# Altium footprint library Miscellaneous C_nn.PcbLib: 416 footprints (part 11 of 26)
Each footprint in its own frame and in the unit in brackets; x right, y up, seen from the top. Pads: shape width x height; smd on the part's side, far side on the other; paste and mask are expansions set on the pad; w line width, h text height; cw(c..) or ccw(c..) is an arc to the next point about the centre after c.
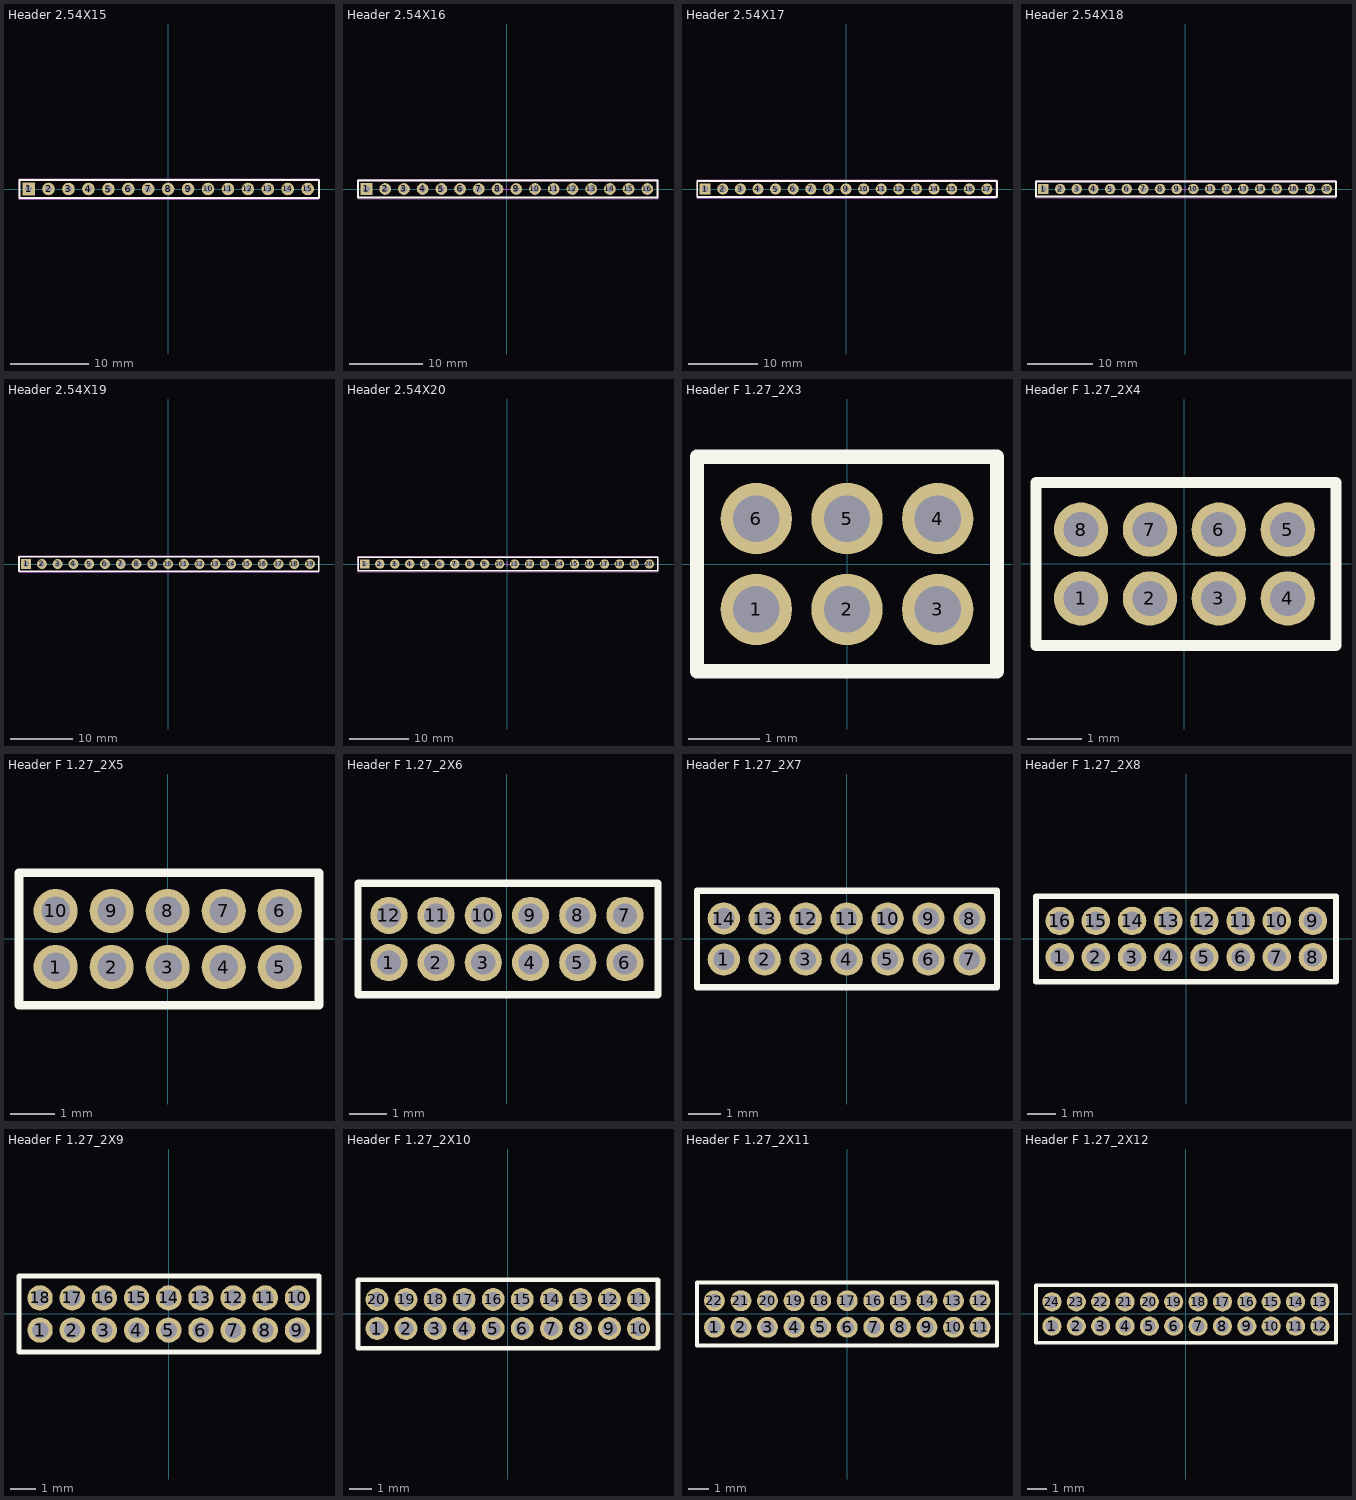
[diagram p10: the footprints below, top view; thin cyan lines are the x and y axes]

## Header 2.54X15 [mm]
pads (15):
  rect 1.6x1.6 hole 0.9: 1(-17.78,0)
  round 1.6 hole 0.9: 2(-15.24,0) 3(-12.7,0) 4(-10.16,0) 5(-7.62,0) 6(-5.08,0) 7(-2.54,0) 8(0,0) 9(2.54,0) 10(5.08,0) 11(7.62,0) 12(10.16,0) 13(12.7,0) 14(15.24,0) 15(17.78,0)
Top Overlay:
  lines w0.254: -18.923,-1.143 19.22,-1.143 19.22,1.143 -18.923,1.143 -18.923,-1.143
Mechanical 15:
  lines w0.1: -19,-1.3 19.2,-1.3 19.2,1.3 -19,1.3 -19,-1.3
3D body "HEADER 2.54X15.stp": height 8.3, standoff -2.9, extent -18.923,-1.228 19.177,1.27

## Header 2.54X16 [mm]
pads (16):
  rect 1.6x1.6 hole 0.9: 1(-19.05,0)
  round 1.6 hole 0.9: 2(-16.51,0) 3(-13.97,0) 4(-11.43,0) 5(-8.89,0) 6(-6.35,0) 7(-3.81,0) 8(-1.27,0) 9(1.27,0) 10(3.81,0) 11(6.35,0) 12(8.89,0) 13(11.43,0) 14(13.97,0) 15(16.51,0) 16(19.05,0)
Top Overlay:
  lines w0.254: -20.193,-1.143 20.45,-1.143 20.45,1.143 -20.193,1.143 -20.193,-1.143
Mechanical 15:
  lines w0.1: -0.5,0 0.5,0 ; 0,-0.5 0,0.5 ; -20.2,-1.3 20.5,-1.3 20.5,1.3 -20.2,1.3 -20.2,-1.3
3D body "HEADER 2.54X16.stp": height 8.3, standoff -2.9, extent -20.193,-1.228 20.447,1.27

## Header 2.54X17 [mm]
pads (17):
  rect 1.6x1.6 hole 0.9: 1(-20.32,0)
  round 1.6 hole 0.9: 2(-17.78,0) 3(-15.24,0) 4(-12.7,0) 5(-10.16,0) 6(-7.62,0) 7(-5.08,0) 8(-2.54,0) 9(0,0) 10(2.54,0) 11(5.08,0) 12(7.62,0) 13(10.16,0) 14(12.7,0) 15(15.24,0) 16(17.78,0) 17(20.32,0)
Top Overlay:
  lines w0.254: -21.463,-1.143 -21.463,1.143 21.78,1.143 21.78,-1.143 -21.463,-1.143
Mechanical 15:
  lines w0.1: -21.5,-1.3 -21.5,1.3 21.7,1.3 21.7,-1.3 -21.5,-1.3
3D body "HEADER 2.54X17.stp": height 8.3, standoff -2.9, extent -21.463,-1.228 21.717,1.27

## Header 2.54X18 [mm]
pads (18):
  rect 1.6x1.6 hole 0.9: 1(-21.59,0)
  round 1.6 hole 0.9: 2(-19.05,0) 3(-16.51,0) 4(-13.97,0) 5(-11.43,0) 6(-8.89,0) 7(-6.35,0) 8(-3.81,0) 9(-1.27,0) 10(1.27,0) 11(3.81,0) 12(6.35,0) 13(8.89,0) 14(11.43,0) 15(13.97,0) 16(16.51,0) 17(19.05,0) 18(21.59,0)
Top Overlay:
  lines w0.254: -22.733,-1.143 -22.733,1.143 23.01,1.143 23.01,-1.143 -22.733,-1.143
Mechanical 15:
  lines w0.1: -0.5,0 0.5,0 ; 0,-0.5 0,0.5 ; -22.7,-1.3 -22.7,1.3 23,1.3 23,-1.3 -22.7,-1.3
3D body "HEADER 2.54X18.stp": height 8.3, standoff -2.9, extent -22.733,-1.228 22.987,1.27

## Header 2.54X19 [mm]
pads (19):
  rect 1.6x1.6 hole 0.9: 1(-22.86,0)
  round 1.6 hole 0.9: 2(-20.32,0) 3(-17.78,0) 4(-15.24,0) 5(-12.7,0) 6(-10.16,0) 7(-7.62,0) 8(-5.08,0) 9(-2.54,0) 10(0,0) 11(2.54,0) 12(5.08,0) 13(7.62,0) 14(10.16,0) 15(12.7,0) 16(15.24,0) 17(17.78,0) 18(20.32,0) 19(22.86,0)
Top Overlay:
  lines w0.254: -24.003,-1.143 24.24,-1.143 24.24,1.143 -24.003,1.143 -24.003,-1.143
Mechanical 15:
  lines w0.1: -24,-1.3 24.3,-1.3 24.3,1.3 -24,1.3 -24,-1.3
3D body "HEADER 2.54X19.stp": height 8.3, standoff -2.9, extent -24.003,-1.228 24.257,1.27

## Header 2.54X20 [mm]
pads (20):
  rect 1.6x1.6 hole 0.9: 1(-24.13,0)
  round 1.6 hole 0.9: 2(-21.59,0) 3(-19.05,0) 4(-16.51,0) 5(-13.97,0) 6(-11.43,0) 7(-8.89,0) 8(-6.35,0) 9(-3.81,0) 10(-1.27,0) 11(1.27,0) 12(3.81,0) 13(6.35,0) 14(8.89,0) 15(11.43,0) 16(13.97,0) 17(16.51,0) 18(19.05,0) 19(21.59,0) 20(24.13,0)
Top Overlay:
  lines w0.254: -25.273,-1.143 -25.273,1.143 25.57,1.143 25.57,-1.143 -25.273,-1.143
Mechanical 15:
  lines w0.1: -0.5,0 0.5,0 ; 0,-0.5 0,0.5 ; -25.3,-1.3 -25.3,1.3 25.6,1.3 25.6,-1.3 -25.3,-1.3
3D body "HEADER 2.54X20.stp": height 8.3, standoff -2.9, extent -25.273,-1.228 25.527,1.27

## Header F 1.27_2X3 [mm]
pads (6):
  round 1 hole 0.65: 1(-1.27,-0.635) 2(0,-0.635) 3(1.27,-0.635) 4(1.27,0.635) 5(0,0.635) 6(-1.27,0.635)
Top Overlay:
  lines w0.2: -2.1,-1.5 -2.1,1.5 2.1,1.5 2.1,-1.5 -2.1,-1.5
Mechanical 15:
  lines w0.1: -2.1,-1.5 2.1,-1.5 2.1,1.5 -2.1,1.5 -2.1,-1.5
3D body "Header-F-1.27-2X6.stp": height 3.4, standoff -2.4, extent -2.105,-1.5 2.105,1.6

## Header F 1.27_2X4 [mm]
pads (8):
  round 1 hole 0.65: 1(-1.905,-0.635) 2(-0.635,-0.635) 3(0.635,-0.635) 4(1.905,-0.635) 5(1.905,0.635) 6(0.635,0.635) 7(-0.635,0.635) 8(-1.905,0.635)
Top Overlay:
  lines w0.2: -2.735,-1.5 -2.735,1.5 2.795,1.5 2.795,-1.5 -2.735,-1.5
Mechanical 15:
  lines w0.1: -2.735,-1.5 2.795,-1.5 2.795,1.5 -2.735,1.5 -2.735,-1.5
3D body "Header-F-1.27-2X8.stp": height 3.4, standoff -2.4, extent -2.74,-1.5 2.74,1.6

## Header F 1.27_2X5 [mm]
pads (10):
  round 1 hole 0.65: 1(-2.54,-0.635) 2(-1.27,-0.635) 3(0,-0.635) 4(1.27,-0.635) 5(2.54,-0.635) 6(2.54,0.635) 7(1.27,0.635) 8(0,0.635) 9(-1.27,0.635) 10(-2.54,0.635)
Top Overlay:
  lines w0.2: -3.37,-1.5 3.43,-1.5 3.43,1.5 -3.37,1.5 -3.37,-1.5
Mechanical 15:
  lines w0.1: -3.37,-1.5 -3.37,1.5 3.43,1.5 3.43,-1.5 -3.37,-1.5
3D body "Header-F-1.27-2X10.stp": height 3.4, standoff -2.4, extent -3.375,-1.5 3.375,1.6

## Header F 1.27_2X6 [mm]
pads (12):
  round 1 hole 0.65: 1(-3.175,-0.635) 2(-1.905,-0.635) 3(-0.635,-0.635) 4(0.635,-0.635) 5(1.905,-0.635) 6(3.175,-0.635) 7(3.175,0.635) 8(1.905,0.635) 9(0.635,0.635) 10(-0.635,0.635) 11(-1.905,0.635) 12(-3.175,0.635)
Top Overlay:
  lines w0.2: -4.005,-1.5 -4.005,1.5 4.065,1.5 4.065,-1.5 -4.005,-1.5
Mechanical 15:
  lines w0.1: -4.005,-1.5 4.065,-1.5 4.065,1.5 -4.005,1.5 -4.005,-1.5
3D body "Header-F-1.27-2X12.stp": height 3.4, standoff -2.4, extent -4.01,-1.5 4.01,1.6

## Header F 1.27_2X7 [mm]
pads (14):
  round 1 hole 0.65: 1(-3.81,-0.635) 2(-2.54,-0.635) 3(-1.27,-0.635) 4(0,-0.635) 5(1.27,-0.635) 6(2.54,-0.635) 7(3.81,-0.635) 8(3.81,0.635) 9(2.54,0.635) 10(1.27,0.635) 11(0,0.635) 12(-1.27,0.635) 13(-2.54,0.635) 14(-3.81,0.635)
Top Overlay:
  lines w0.2: -4.64,-1.5 4.66,-1.5 4.66,1.5 -4.64,1.5 -4.64,-1.5
Mechanical 15:
  lines w0.1: -4.64,-1.5 -4.64,1.5 4.66,1.5 4.66,-1.5 -4.64,-1.5
3D body "Header-F-1.27-2X14.stp": height 3.4, standoff -2.4, extent -4.645,-1.5 4.645,1.6

## Header F 1.27_2X8 [mm]
pads (16):
  round 1 hole 0.65: 1(-4.445,-0.635) 2(-3.175,-0.635) 3(-1.905,-0.635) 4(-0.635,-0.635) 5(0.635,-0.635) 6(1.905,-0.635) 7(3.175,-0.635) 8(4.445,-0.635) 9(4.445,0.635) 10(3.175,0.635) 11(1.905,0.635) 12(0.635,0.635) 13(-0.635,0.635) 14(-1.905,0.635) 15(-3.175,0.635) 16(-4.445,0.635)
Top Overlay:
  lines w0.2: -5.275,-1.5 -5.275,1.5 5.255,1.5 5.255,-1.5 -5.275,-1.5
Mechanical 15:
  lines w0.1: -5.275,-1.5 5.255,-1.5 5.255,1.5 -5.275,1.5 -5.275,-1.5
3D body "Header-F-1.27-2X16.stp": height 3.4, standoff -2.4, extent -5.28,-1.5 5.28,1.6

## Header F 1.27_2X9 [mm]
pads (18):
  round 1 hole 0.65: 1(-5.08,-0.635) 2(-3.81,-0.635) 3(-2.54,-0.635) 4(-1.27,-0.635) 5(0,-0.635) 6(1.27,-0.635) 7(2.54,-0.635) 8(3.81,-0.635) 9(5.08,-0.635) 10(5.08,0.635) 11(3.81,0.635) 12(2.54,0.635) 13(1.27,0.635) 14(0,0.635) 15(-1.27,0.635) 16(-2.54,0.635) 17(-3.81,0.635) 18(-5.08,0.635)
Top Overlay:
  lines w0.2: -5.91,-1.5 5.93,-1.5 5.93,1.5 -5.91,1.5 -5.91,-1.5
Mechanical 15:
  lines w0.1: -5.91,-1.5 -5.91,1.5 5.93,1.5 5.93,-1.5 -5.91,-1.5
3D body "Header-F-1.27-2X18.stp": height 3.4, standoff -2.4, extent -5.915,-1.5 5.915,1.6

## Header F 1.27_2X10 [mm]
pads (20):
  round 1 hole 0.65: 1(-5.715,-0.635) 2(-4.445,-0.635) 3(-3.175,-0.635) 4(-1.905,-0.635) 5(-0.635,-0.635) 6(0.635,-0.635) 7(1.905,-0.635) 8(3.175,-0.635) 9(4.445,-0.635) 10(5.715,-0.635) 11(5.715,0.635) 12(4.445,0.635) 13(3.175,0.635) 14(1.905,0.635) 15(0.635,0.635) 16(-0.635,0.635) 17(-1.905,0.635) 18(-3.175,0.635) 19(-4.445,0.635) 20(-5.715,0.635)
Top Overlay:
  lines w0.2: -6.545,-1.5 -6.545,1.5 6.565,1.5 6.565,-1.5 -6.545,-1.5
Mechanical 15:
  lines w0.1: -6.545,-1.5 6.565,-1.5 6.565,1.5 -6.545,1.5 -6.545,-1.5
3D body "Header-F-1.27-2X20.stp": height 3.4, standoff -2.4, extent -6.55,-1.5 6.55,1.6

## Header F 1.27_2X11 [mm]
pads (22):
  round 1 hole 0.65: 1(-6.35,-0.635) 2(-5.08,-0.635) 3(-3.81,-0.635) 4(-2.54,-0.635) 5(-1.27,-0.635) 6(0,-0.635) 7(1.27,-0.635) 8(2.54,-0.635) 9(3.81,-0.635) 10(5.08,-0.635) 11(6.35,-0.635) 12(6.35,0.635) 13(5.08,0.635) 14(3.81,0.635) 15(2.54,0.635) 16(1.27,0.635) 17(0,0.635) 18(-1.27,0.635) 19(-2.54,0.635) 20(-3.81,0.635) 21(-5.08,0.635) 22(-6.35,0.635)
Top Overlay:
  lines w0.2: -7.18,-1.5 7.16,-1.5 7.16,1.5 -7.18,1.5 -7.18,-1.5
Mechanical 15:
  lines w0.1: -7.18,-1.5 -7.18,1.5 7.16,1.5 7.16,-1.5 -7.18,-1.5
3D body "Header-F-1.27-2X22.stp": height 3.4, standoff -2.4, extent -7.185,-1.5 7.185,1.6

## Header F 1.27_2X12 [mm]
pads (24):
  round 1 hole 0.65: 1(-6.985,-0.635) 2(-5.715,-0.635) 3(-4.445,-0.635) 4(-3.175,-0.635) 5(-1.905,-0.635) 6(-0.635,-0.635) 7(0.635,-0.635) 8(1.905,-0.635) 9(3.175,-0.635) 10(4.445,-0.635) 11(5.715,-0.635) 12(6.985,-0.635) 13(6.985,0.635) 14(5.715,0.635) 15(4.445,0.635) 16(3.175,0.635) 17(1.905,0.635) 18(0.635,0.635) 19(-0.635,0.635) 20(-1.905,0.635) 21(-3.175,0.635) 22(-4.445,0.635) 23(-5.715,0.635) 24(-6.985,0.635)
Top Overlay:
  lines w0.2: -7.815,-1.5 7.825,-1.5 7.825,1.5 -7.815,1.5 -7.815,-1.5
Mechanical 15:
  lines w0.1: -7.815,-1.5 -7.815,1.5 7.825,1.5 7.825,-1.5 -7.815,-1.5
3D body "Header-F-1.27-2X24.stp": height 3.4, standoff -2.4, extent -7.82,-1.5 7.82,1.6